# Altium footprint library ZZQ_PCBLib.PcbLib: 84 footprints (part 5 of 6)
Each footprint in its own frame and in the unit in brackets; x right, y up, seen from the top. Pads: shape width x height; smd on the part's side, far side on the other; paste and mask are expansions set on the pad; w line width, h text height; cw(c..) or ccw(c..) is an arc to the next point about the centre after c.
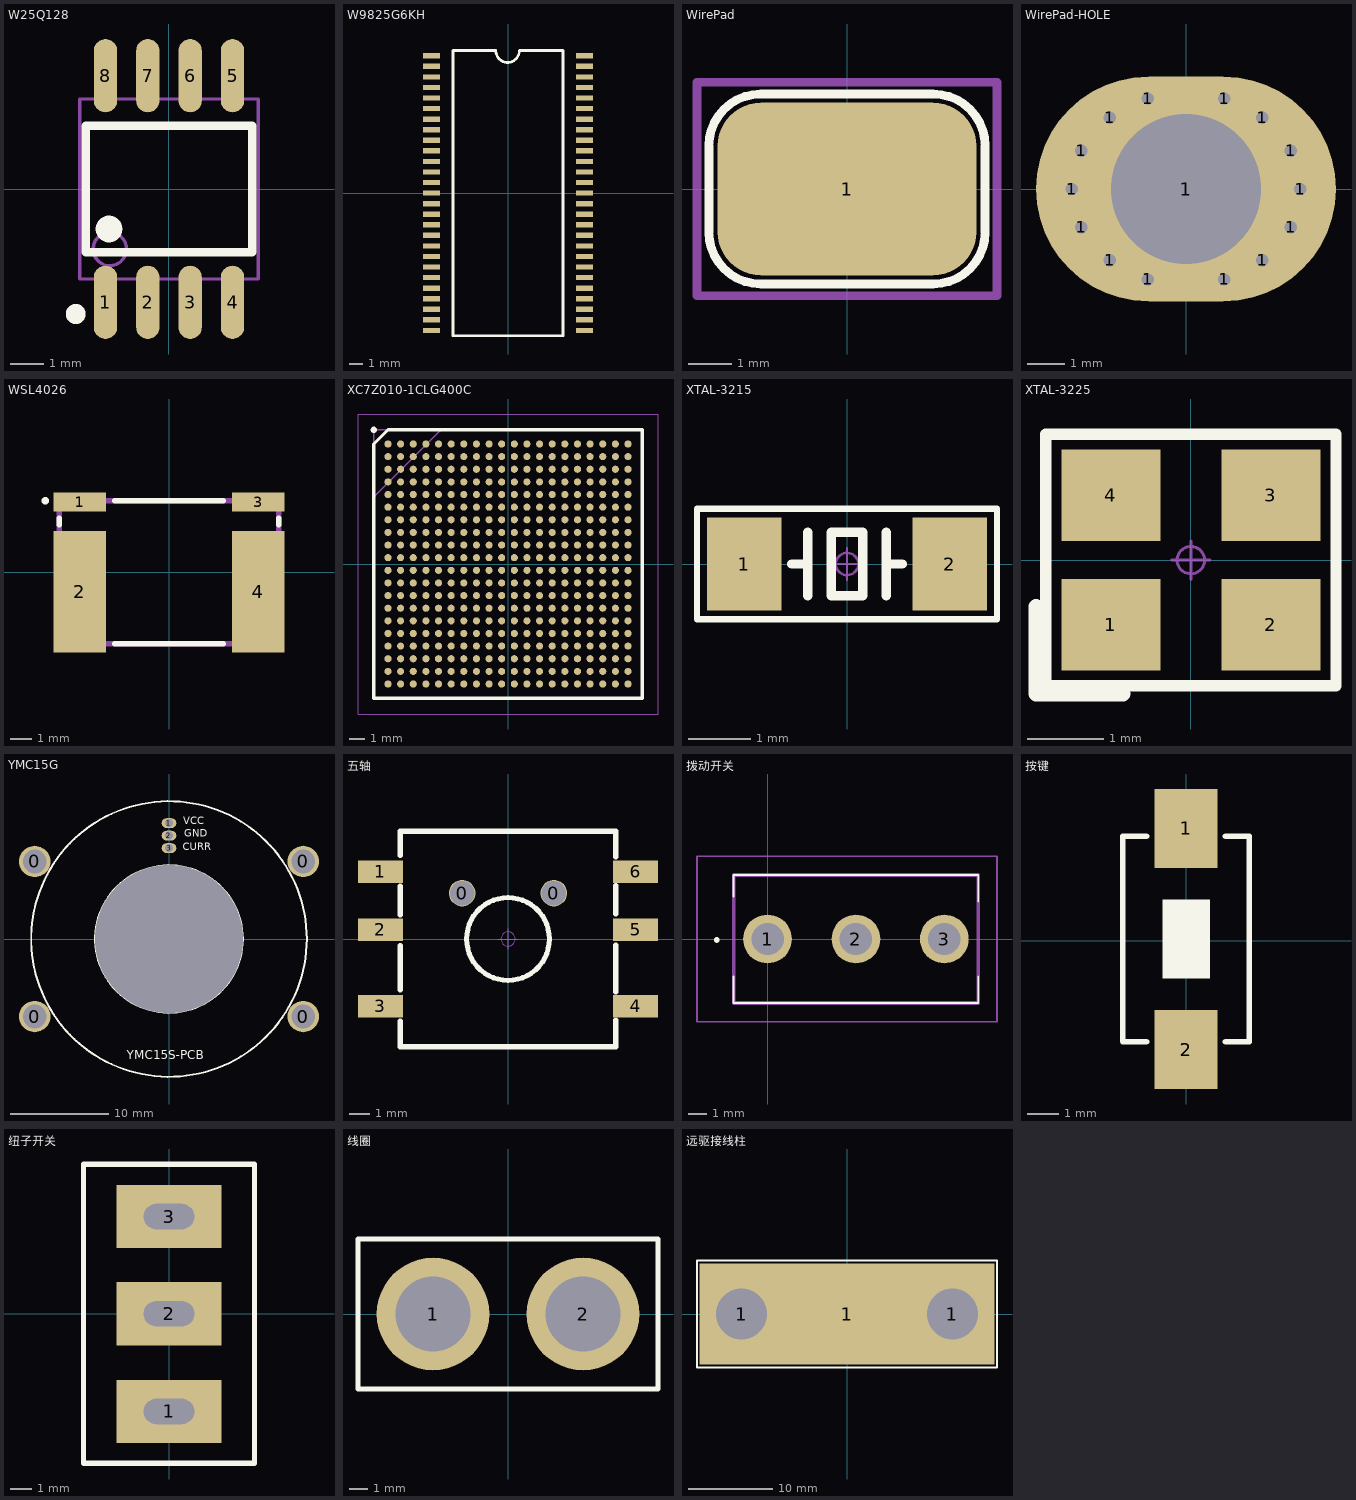
[diagram p4: the footprints below, top view; thin cyan lines are the x and y axes]

## W25Q128 [mm]
pads (8):
  oval 0.7x2.2 smd: 1(-1.905,-3.4) 2(-0.635,-3.4) 3(0.635,-3.4) 4(1.905,-3.4) 5(1.905,3.4) 6(0.635,3.4) 7(-0.635,3.4) 8(-1.905,3.4)
Top Overlay:
  circle w0.3: c-2.797,-3.75 r0.15
  circle w0.4: c-1.8,-1.2 r0.2
  lines w0.254: -2.5,-1.9 -2.5,1.9 2.5,1.9 2.5,-1.9 -2.5,-1.9
Mechanical 13:
  circle w0.1: c-1.775,-1.8 r0.5
  lines w0.1: -2.675,-2.7 -2.675,2.7 2.675,2.7 2.675,-2.7 -2.675,-2.7
3D body "SOP8E .STEP": height 1.9, standoff 0, extent -2.64,-3.943 2.64,3.943

## W9825G6KH [mm]
pads (54):
  rect 1.3x0.4 smd: 1(-5.8,10.4) 2(-5.8,9.6) 3(-5.8,8.8) 4(-5.8,8) 5(-5.8,7.2) 6(-5.8,6.4) 7(-5.8,5.6) 8(-5.8,4.8) 9(-5.8,4) 10(-5.8,3.2) 11(-5.8,2.4) 12(-5.8,1.6) 13(-5.8,0.8) 14(-5.8,0) 15(-5.8,-0.8) 16(-5.8,-1.6) 17(-5.8,-2.4) 18(-5.8,-3.2) 19(-5.8,-4) 20(-5.8,-4.8) 21(-5.8,-5.6) 22(-5.8,-6.4) 23(-5.8,-7.2) 24(-5.8,-8) 25(-5.8,-8.8) 26(-5.8,-9.6) 27(-5.8,-10.4) 28(5.8,-10.4) 29(5.8,-9.6) 30(5.8,-8.8) 31(5.8,-8) 32(5.8,-7.2) 33(5.8,-6.4) 34(5.8,-5.6) 35(5.8,-4.8) 36(5.8,-4) 37(5.8,-3.2) 38(5.8,-2.4) 39(5.8,-1.6) 40(5.8,-0.8) 41(5.8,0) 42(5.8,0.8) 43(5.8,1.6) 44(5.8,2.4) 45(5.8,3.2) 46(5.8,4) 47(5.8,4.8) 48(5.8,5.6) 49(5.8,6.4) 50(5.8,7.2) 51(5.8,8) 52(5.8,8.8) 53(5.8,9.6) 54(5.8,10.4)
Top Overlay:
  lines w0.2: -0.939,10.8 -4.165,10.8 -4.165,-10.8 4.165,-10.8 4.165,10.8 0.877,10.8 ; -0.92,10.781 ccw(c-0.031,10.781) 0.858,10.781
3D body "SW3dPS-TSOP2-54.STEP": height 1.3, standoff -0.4, extent -5.886,-11.109 5.874,11.111

## WirePad [mm] "焊线盘 表贴 4.5mm x 7mm"
height 1.8
pads (1):
  rrect50% 6x4 smd: 1(0,0)
Top Overlay:
  lines w0.203: -3.2,-1 ccw(c-2,-1) -2,-2.2 2,-2.2 ccw(c2,-1) 3.2,-1 3.2,1 ccw(c2,1) 2,2.2 -2,2.2 ccw(c-2,1) -3.2,1 -3.2,-1
Top Designator:
  text ".Designator" at -2.252,-0.226 h1
Top Component Outline:
  lines w0.2: -3.475,-2.475 3.475,-2.475 3.475,2.475 -3.475,2.475 -3.475,-2.475
Top Component Center:
  circle w0.1: c0,0 r0.5
  lines w0.1: -1,0 1,0 ; 0,-1 0,1

## WirePad-HOLE [mil] "焊线盘 表贴 4.5mm x 7mm"
height 70.87
pads (15):
  round 22 hole 13: 1(-120,0) 1(-110,-40) 1(-110,40) 1(-80,-75) 1(-80,75) 1(-40,-95) 1(-40,95) 1(40,-95) 1(40,95) 1(80,-75) 1(80,75) 1(110,-40) 1(110,40) 1(120,0)
  oval 314.96x236.22 hole 157.48: 1(0,0)

## WSL4026 [mm]
pads (4):
  rect 2.44x0.89 smd: 1(-4.115,3.245) 3(4.115,3.245)
  rect 2.44x5.6 smd: 2(-4.115,-0.89) 4(4.115,-0.89)
Top Overlay:
  circle w0.254: c-5.702,3.298 r0.043
  lines w0.254: -5.05,2.2 -5.05,2.5 ; -2.5,-3.3 2.5,-3.3 ; -2.5,3.3 2.5,3.3 ; 5.05,2.2 5.05,2.5
Mechanical 13:
  lines w0.254: -5.05,-3.3 -5.05,3.3 5.05,3.3 5.05,-3.3 -5.05,-3.3
3D body "WSLP4026L5000FEA.stp": height 2.95, standoff 0, extent -5.04,-3.05 5.06,3.55

## XC7Z010-1CLG400C [mm]
pads (400):
  round 0.45 smd: A1(-7.6,7.6) A2(-6.8,7.6) A3(-6,7.6) A4(-5.2,7.6) A5(-4.4,7.6) A6(-3.6,7.6) A7(-2.8,7.6) A8(-2,7.6) A9(-1.2,7.6) A10(-0.4,7.6) A11(0.4,7.6) A12(1.2,7.6) A13(2,7.6) A14(2.8,7.6) A15(3.6,7.6) A16(4.4,7.6) A17(5.2,7.6) A18(6,7.6) A19(6.8,7.6) A20(7.6,7.6) B1(-7.6,6.8) B2(-6.8,6.8) B3(-6,6.8) B4(-5.2,6.8) B5(-4.4,6.8) B6(-3.6,6.8) B7(-2.8,6.8) B8(-2,6.8) B9(-1.2,6.8) B10(-0.4,6.8) B11(0.4,6.8) B12(1.2,6.8) B13(2,6.8) B14(2.8,6.8) B15(3.6,6.8) B16(4.4,6.8) B17(5.2,6.8) B18(6,6.8) B19(6.8,6.8) B20(7.6,6.8) C1(-7.6,6) C2(-6.8,6) C3(-6,6) C4(-5.2,6) C5(-4.4,6) C6(-3.6,6) C7(-2.8,6) C8(-2,6) C9(-1.2,6) C10(-0.4,6) C11(0.4,6) C12(1.2,6) C13(2,6) C14(2.8,6) C15(3.6,6) C16(4.4,6) C17(5.2,6) C18(6,6) C19(6.8,6) C20(7.6,6) D1(-7.6,5.2) D2(-6.8,5.2) D3(-6,5.2) D4(-5.2,5.2) D5(-4.4,5.2) D6(-3.6,5.2) D7(-2.8,5.2) D8(-2,5.2) D9(-1.2,5.2) D10(-0.4,5.2) D11(0.4,5.2) D12(1.2,5.2) D13(2,5.2) D14(2.8,5.2) D15(3.6,5.2) D16(4.4,5.2) D17(5.2,5.2) D18(6,5.2) D19(6.8,5.2) D20(7.6,5.2) E1(-7.6,4.4) E2(-6.8,4.4) E3(-6,4.4) E4(-5.2,4.4) E5(-4.4,4.4) E6(-3.6,4.4) E7(-2.8,4.4) E8(-2,4.4) E9(-1.2,4.4) E10(-0.4,4.4) E11(0.4,4.4) E12(1.2,4.4) E13(2,4.4) E14(2.8,4.4) E15(3.6,4.4) E16(4.4,4.4) E17(5.2,4.4) E18(6,4.4) E19(6.8,4.4) E20(7.6,4.4) F1(-7.6,3.6) F2(-6.8,3.6) F3(-6,3.6) F4(-5.2,3.6) F5(-4.4,3.6) F6(-3.6,3.6) F7(-2.8,3.6) F8(-2,3.6) F9(-1.2,3.6) F10(-0.4,3.6) F11(0.4,3.6) F12(1.2,3.6) F13(2,3.6) F14(2.8,3.6) F15(3.6,3.6) F16(4.4,3.6) F17(5.2,3.6) F18(6,3.6) F19(6.8,3.6) F20(7.6,3.6) G1(-7.6,2.8) G2(-6.8,2.8) G3(-6,2.8) G4(-5.2,2.8) G5(-4.4,2.8) G6(-3.6,2.8) G7(-2.8,2.8) G8(-2,2.8) G9(-1.2,2.8) G10(-0.4,2.8) G11(0.4,2.8) G12(1.2,2.8) G13(2,2.8) G14(2.8,2.8) G15(3.6,2.8) G16(4.4,2.8) G17(5.2,2.8) G18(6,2.8) G19(6.8,2.8) G20(7.6,2.8) H1(-7.6,2) H2(-6.8,2) H3(-6,2) H4(-5.2,2) H5(-4.4,2) H6(-3.6,2) H7(-2.8,2) H8(-2,2) H9(-1.2,2) H10(-0.4,2) H11(0.4,2) H12(1.2,2) H13(2,2) H14(2.8,2) H15(3.6,2) H16(4.4,2) H17(5.2,2) H18(6,2) H19(6.8,2) H20(7.6,2) J1(-7.6,1.2) J2(-6.8,1.2) J3(-6,1.2) J4(-5.2,1.2) J5(-4.4,1.2) J6(-3.6,1.2) J7(-2.8,1.2) J8(-2,1.2) J9(-1.2,1.2) J10(-0.4,1.2) J11(0.4,1.2) J12(1.2,1.2) J13(2,1.2) J14(2.8,1.2) J15(3.6,1.2) J16(4.4,1.2) J17(5.2,1.2) J18(6,1.2) J19(6.8,1.2) J20(7.6,1.2) K1(-7.6,0.4) K2(-6.8,0.4) K3(-6,0.4) K4(-5.2,0.4) K5(-4.4,0.4) K6(-3.6,0.4) K7(-2.8,0.4) K8(-2,0.4) K9(-1.2,0.4) K10(-0.4,0.4) K11(0.4,0.4) K12(1.2,0.4) K13(2,0.4) K14(2.8,0.4) K15(3.6,0.4) K16(4.4,0.4) K17(5.2,0.4) K18(6,0.4) K19(6.8,0.4) K20(7.6,0.4) L1(-7.6,-0.4) L2(-6.8,-0.4) L3(-6,-0.4) L4(-5.2,-0.4) L5(-4.4,-0.4) L6(-3.6,-0.4) L7(-2.8,-0.4) L8(-2,-0.4) L9(-1.2,-0.4) L10(-0.4,-0.4) L11(0.4,-0.4) L12(1.2,-0.4) L13(2,-0.4) L14(2.8,-0.4) L15(3.6,-0.4) L16(4.4,-0.4) L17(5.2,-0.4) L18(6,-0.4) L19(6.8,-0.4) L20(7.6,-0.4) M1(-7.6,-1.2) M2(-6.8,-1.2) M3(-6,-1.2) M4(-5.2,-1.2) M5(-4.4,-1.2) M6(-3.6,-1.2) M7(-2.8,-1.2) M8(-2,-1.2) M9(-1.2,-1.2) M10(-0.4,-1.2) M11(0.4,-1.2) M12(1.2,-1.2) M13(2,-1.2) M14(2.8,-1.2) M15(3.6,-1.2) M16(4.4,-1.2) M17(5.2,-1.2) M18(6,-1.2) M19(6.8,-1.2) M20(7.6,-1.2) N1(-7.6,-2) N2(-6.8,-2) N3(-6,-2) N4(-5.2,-2) N5(-4.4,-2) N6(-3.6,-2) N7(-2.8,-2) N8(-2,-2) N9(-1.2,-2) N10(-0.4,-2) N11(0.4,-2) N12(1.2,-2) N13(2,-2) N14(2.8,-2) N15(3.6,-2) N16(4.4,-2) N17(5.2,-2) N18(6,-2) N19(6.8,-2) N20(7.6,-2) P1(-7.6,-2.8) P2(-6.8,-2.8) P3(-6,-2.8) P4(-5.2,-2.8) P5(-4.4,-2.8) P6(-3.6,-2.8) P7(-2.8,-2.8) P8(-2,-2.8) P9(-1.2,-2.8) P10(-0.4,-2.8) P11(0.4,-2.8) P12(1.2,-2.8) P13(2,-2.8) P14(2.8,-2.8) P15(3.6,-2.8) P16(4.4,-2.8) P17(5.2,-2.8) P18(6,-2.8) P19(6.8,-2.8) P20(7.6,-2.8) R1(-7.6,-3.6) R2(-6.8,-3.6) R3(-6,-3.6) R4(-5.2,-3.6) R5(-4.4,-3.6) R6(-3.6,-3.6) R7(-2.8,-3.6) R8(-2,-3.6) R9(-1.2,-3.6) R10(-0.4,-3.6) R11(0.4,-3.6) R12(1.2,-3.6) R13(2,-3.6) R14(2.8,-3.6) R15(3.6,-3.6) R16(4.4,-3.6) R17(5.2,-3.6) R18(6,-3.6) R19(6.8,-3.6) R20(7.6,-3.6) T1(-7.6,-4.4) T2(-6.8,-4.4) T3(-6,-4.4) T4(-5.2,-4.4) T5(-4.4,-4.4) T6(-3.6,-4.4) T7(-2.8,-4.4) T8(-2,-4.4) T9(-1.2,-4.4) T10(-0.4,-4.4) T11(0.4,-4.4) T12(1.2,-4.4) T13(2,-4.4) T14(2.8,-4.4) T15(3.6,-4.4) T16(4.4,-4.4) T17(5.2,-4.4) T18(6,-4.4) T19(6.8,-4.4) T20(7.6,-4.4) U1(-7.6,-5.2) U2(-6.8,-5.2) U3(-6,-5.2) U4(-5.2,-5.2) U5(-4.4,-5.2) U6(-3.6,-5.2) U7(-2.8,-5.2) U8(-2,-5.2) U9(-1.2,-5.2) U10(-0.4,-5.2) U11(0.4,-5.2) U12(1.2,-5.2) U13(2,-5.2) U14(2.8,-5.2) U15(3.6,-5.2) U16(4.4,-5.2) U17(5.2,-5.2) U18(6,-5.2) U19(6.8,-5.2) U20(7.6,-5.2) V1(-7.6,-6) V2(-6.8,-6) V3(-6,-6) V4(-5.2,-6) V5(-4.4,-6) V6(-3.6,-6) V7(-2.8,-6) V8(-2,-6) V9(-1.2,-6) V10(-0.4,-6) V11(0.4,-6) V12(1.2,-6) V13(2,-6) V14(2.8,-6) V15(3.6,-6) V16(4.4,-6) V17(5.2,-6) V18(6,-6) V19(6.8,-6) V20(7.6,-6) W1(-7.6,-6.8) W2(-6.8,-6.8) W3(-6,-6.8) W4(-5.2,-6.8) W5(-4.4,-6.8) W6(-3.6,-6.8) W7(-2.8,-6.8) W8(-2,-6.8) W9(-1.2,-6.8) W10(-0.4,-6.8) W11(0.4,-6.8) W12(1.2,-6.8) W13(2,-6.8) W14(2.8,-6.8) W15(3.6,-6.8) W16(4.4,-6.8) W17(5.2,-6.8) W18(6,-6.8) W19(6.8,-6.8) W20(7.6,-6.8) Y1(-7.6,-7.6) Y2(-6.8,-7.6) Y3(-6,-7.6) Y4(-5.2,-7.6) Y5(-4.4,-7.6) Y6(-3.6,-7.6) Y7(-2.8,-7.6) Y8(-2,-7.6) Y9(-1.2,-7.6) Y10(-0.4,-7.6) Y11(0.4,-7.6) Y12(1.2,-7.6) Y13(2,-7.6) Y14(2.8,-7.6) Y15(3.6,-7.6) Y16(4.4,-7.6) Y17(5.2,-7.6) Y18(6,-7.6) Y19(6.8,-7.6) Y20(7.6,-7.6)
Top Overlay:
  circle w0.2: c-8.5,8.5 r0.1
  lines w0.2: -8.5,-8.5 8.5,-8.5 8.5,8.5 -7.6,8.5 -8.5,7.6 -8.5,-8.5
Mechanical 13:
  lines w0.1: -8.5,4.25 -4.25,8.5 ; -8.5,-8.5 8.5,-8.5 8.5,8.5 -8.5,8.5 -8.5,-8.5
Mechanical 15:
  lines w0.05: -9.5,-9.5 9.5,-9.5 9.5,9.5 -9.5,9.5 -9.5,-9.5
3D body "XC7Z010-1CLG400C.stp": height 1.6, standoff 0, extent -8.5,-8.5 8.5,8.5

## XTAL-3215 [mm] "3.2*1.5*0.6mm(长宽高)"
pads (2):
  rect 1.2x1.5 smd: 1(-1.65,0) 2(1.65,0)
Top Overlay:
  lines w0.1: -2.413,-0.889 -2.413,0.889 2.413,0.889 2.413,-0.889 -2.413,-0.889
  lines w0.152: -0.889,0 -0.635,0 ; -0.635,-0.508 -0.635,0.508 ; 0.635,-0.508 0.635,0.508 ; 0.635,0 0.889,0 ; -0.254,-0.508 0.254,-0.508 0.254,0.508 -0.254,0.508 -0.254,-0.508
Mechanical 15:
  circle w0.04: c0,0 r0.18
  lines w0.04: -0.254,0 0.254,0 ; 0,-0.254 0,0.254
3D body "OSC_3215-2.STEP": height 0.61, standoff -0.01, extent -1.6,-0.75 1.6,0.75

## XTAL-3225 [mm] "3.2*2.5*0.7mm(长宽高)                             淘宝ID:黄晶宝石"
pads (4):
  rect 1.3x1.2 smd: 1(-1.05,-0.85) 2(1.05,-0.85) 3(1.05,0.85) 4(-1.05,0.85)
Top Overlay:
  lines w0.15: -1.905,-1.651 1.905,-1.651 1.905,1.651 -1.905,1.651 -1.905,-1.651
  lines w0.2: -2.032,-1.753 -0.889,-1.753 ; -2.032,-1.727 -2.032,-0.61
Mechanical 15:
  circle w0.04: c0,0 r0.18
  lines w0.04: -0.254,0 0.254,0 ; 0,-0.254 0,0.254
3D body "OSC_3225-4.STEP": height 0.7, standoff -0.02, extent -1.6,-1.25 1.6,1.25

## YMC15G [mm]
pads (7):
  round 3.2 hole 2.4: 0(-13.64,-7.875) 0(-13.64,7.875) 0(13.64,-7.875) 0(13.64,7.875)
  oval 1.5x1 hole 0.8: 1(0,11.77) 2(0,10.5) 3(0,9.23)
via 0,0 diameter 15 hole 15
Top Overlay:
  circle w0.2: c0,0 r14
  circle w0.2: c0,0 r7.5
  text "YMC15S-PCB" at -4.309,-12.501 h1.5
  text "CURR" at 1.397,8.763 h1.27
  text "VCC" at 1.45,11.4 h1.27
  text "GND" at 1.524,10.16 h1.27
3D body "C15S-3D.STEP": height 12.4, standoff -3.3, extent -15.64,-14.399 15.64,14.4

## 五轴 [mm] "6脚，长：10.5，宽：10，高：9mm"
pads (8):
  round 1.3 hole 1.2: 0(-2.25,2.25) 0(2.25,2.25)
  rect 2.2x1.1 smd: 1(-6.262,3.3) 2(-6.262,0.45) 3(-6.262,-3.3) 4(6.262,-3.3) 5(6.262,0.45) 6(6.262,3.3)
Top Overlay:
  circle w0.25: c0,0 r2.032
  lines w0.254: -5.287,-4.017 -5.287,-5.287 5.287,-5.287 5.287,-3.984 ; -5.287,-2.493 -5.287,-0.334 ; -5.287,1.19 -5.287,2.587 ; -5.287,4.111 -5.287,5.287 5.287,5.287 5.287,4.017 ; 5.287,-2.587 5.287,-0.301 ; 5.287,1.223 5.287,2.62
Mechanical 15:
  circle w0.05: c0,0 r0.35
  lines w0.05: -0.5,0 0.5,0 ; 0,-0.5 0,0.5
3D body "TSW_10x10x9.STEP": height 0.15, standoff -9.55, extent -6.5,-5.16 6.5,5.16

## 拨动开关 [mm] "SS12D10"
pads (3):
  round 2.59 hole 1.726: 1(0,0) 2(4.7,0) 3(9.4,0)
Top Overlay:
  lines w0.1: -1.8,-3.4 -1.8,-2 -1.8,-3.4 ; -1.8,-3.4 11.2,-3.4 ; -1.8,-3.4 11.2,-3.4 ; -1.8,3.4 11.2,3.4 ; -1.8,3.4 11.2,3.4 ; -1.8,3.4 -1.8,2.25 -1.8,3.4 ; 11.2,-3.4 11.2,-2 11.2,-3.4 ; 11.2,3.4 11.2,2 11.2,3.4
  lines w0.2: -2.7,-0.1 ccw(c-2.7,-0.05) -2.7,0 ; -2.7,-0.1 cw(c-2.7,-0.05) -2.7,0 ; -2.7,-0.1 ccw(c-2.7,-0.05) -2.7,0
Mechanical 15:
  lines w0.2: -1.8,-3.4 -1.8,3.4 11.2,3.4 11.2,-3.4 -1.8,-3.4
Mechanical 20:
  lines w0.1: -3.75,-4.4 -3.75,4.4 12.2,4.4 12.2,-4.4 -3.75,-4.4
3D body "SS-12D10L5.stp": height 11.4, standoff -6.9, extent -1.8,-3.4 11.2,3.4

## 按键 [mm]
height 4
pads (2):
  rect 2x2.5 smd: 1(0,3.556) 2(0,-3.444)
Top Overlay:
  region: -0.747,1.309 -0.747,-1.191 0.753,-1.191 0.753,1.309
  lines w0.178: -1.25,-3.194 -2,-3.19 -2,3.306 -1.25,3.306 ; 1.25,-3.194 2,-3.194 2,3.306 1.25,3.306
3D body "SMD按键.STEP": height 2.5, standoff 0, extent -1.933,-3.945 1.917,3.945

## 纽子开关 [mm]
pads (3):
  rect 5x3 hole 1.2 slot 2.4 at 0 deg: 1(0,-4.648) 2(0,0) 3(0,4.623)
Top Overlay:
  lines w0.254: -4.064,-7.112 4.064,-7.112 4.064,7.112 -4.064,7.112 -4.064,-7.112

## 线圈 [mm]
pads (2):
  round 6 hole 4: 1(-4,0) 2(4,0)
Top Overlay:
  lines w0.254: -8,-4 8,-4 8,4 -8,4 -8,-4

## 远驱接线柱 [mm]
pads (3):
  round 6 hole 6: 1(-12.5,0) 1(12.5,0)
  rect 35x12 smd mask+0.051: 1(0,0)
Top Overlay:
  lines w0.254: -17.78,-6.35 -17.78,6.35 17.78,6.35 17.78,-6.35 -17.78,-6.35
3D body "远驱接线柱.STEP": height 53, standoff 0, extent -17.5,-6 17.5,6

## 远驱铜柱孔 [mm]
via 0,0 diameter 15 hole 15